# Altium footprint library mobinbyn-Capacitor.PcbLib: 152 footprints (part 10 of 10)
Each footprint in its own frame and in the unit in brackets; x right, y up, seen from the top. Pads: shape width x height; smd on the part's side, far side on the other; paste and mask are expansions set on the pad; w line width, h text height; cw(c..) or ccw(c..) is an arc to the next point about the centre after c.
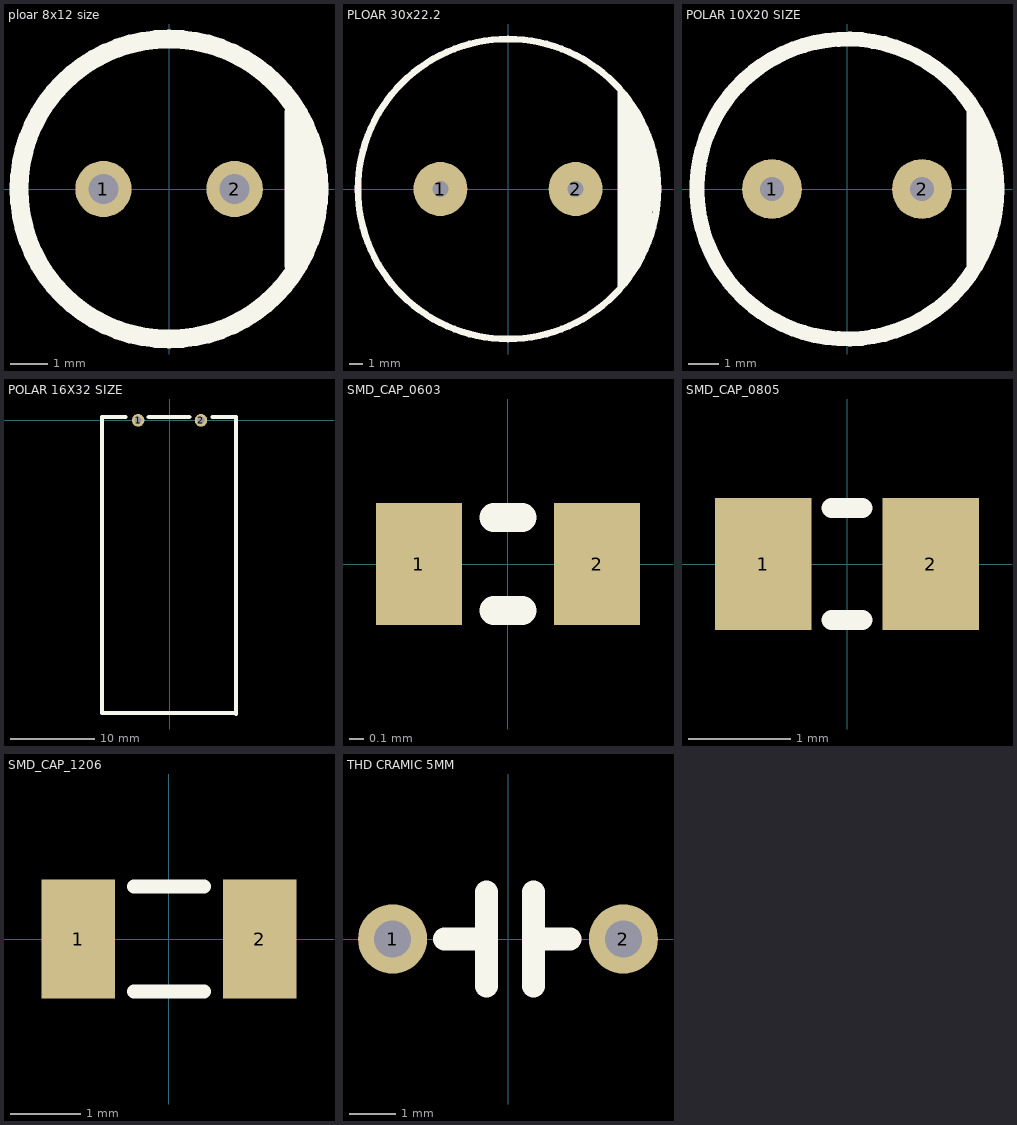
[diagram p9: the footprints below, top view; thin cyan lines are the x and y axes]

## ploar 8x12 size [mm]
pads (2):
  round 1.5 hole 0.8: 1(-1.75,0) 2(1.75,0)
Top Overlay:
  circle w0.5: c0,0 r4
  lines w0.5: 3.33,-2.032 3.33,1.27 3.711,0.889 3.711,-1.397 3.33,-1.778 3.33,2.032
3D body "CAPACITOR RADIAL 8X12.STEP": height 12, standoff -2.5, extent -4,-4 4,4

## PLOAR 30x22.2 [mm]
pads (2):
  round 4 hole 1.2: 1(-5,0) 2(5,0)
Top Overlay:
  circle w0.5: c0,0 r11.1
  lines w0.3: 8.255,-7.239 8.255,7.239 ; 8.509,-7.112 8.509,6.985 ; 8.636,-6.858 8.636,6.604 ; 8.89,-6.604 8.89,6.604 ; 9.144,6.096 9.144,-6.096 9.271,-6.096 9.271,5.715 9.398,5.715 9.398,-5.334 9.525,-5.334 9.525,5.08 9.652,5.08 9.652,4.826 ; 9.652,4.826 9.906,4.826 9.906,-5.08 9.779,-5.08 9.779,4.826 9.652,4.826 ; 9.652,4.826 9.652,4.318 10.033,4.318 10.033,-4.064 10.287,-4.064 10.287,3.937 10.16,3.937 10.16,-3.048 10.541,-3.048 10.541,3.048 10.287,3.048 10.287,1.778 10.668,1.778 ; 10.668,1.778 10.668,-1.524 10.922,-1.524 10.922,1.778 10.668,1.778
3D body "CAPASITOR 22.3x33.STEP": height 33.37, standoff -4.63, extent -11.1,-11.1 11.1,11.1

## POLAR 10X20 SIZE [mm]
pads (2):
  round 2 hole 0.8: 1(-2.5,0) 2(2.5,0)
Top Overlay:
  circle w0.5: c0,0 r5
  lines w0.5: 4.231,2.54 4.231,-2.54 4.358,-2.413 4.358,-1.016 4.485,-0.889 4.485,0.635 4.612,0.762 4.612,1.397 4.739,1.27 4.739,-0.127
3D body "User Library-Cap electro 10x20x5_0mm.step": height 20.28, standoff -3.99, extent -5.025,-5.027 5.026,5.023

## POLAR 16X32 SIZE [mm]
pads (2):
  round 1.5 hole 0.8: 1(-3.75,0) 2(3.75,0)
Top Overlay:
  lines w0.5: -5.274,0.381 -8.068,0.381 -8.068,-34.925 7.807,-34.925 7.934,-35.052 7.934,0.381 5.14,0.381 ; -2.48,0.381 2.346,0.381
3D body "User Library-Cap electrolitic radial 16x32.STEP": height 16.5, standoff -1.5, extent -7.997,-35 7.997,0.4

## SMD_CAP_0603 [mm]
pads (2):
  rect 0.6x0.85 smd: 1(-0.622,0) 2(0.622,0)
Top Overlay:
  lines w0.2: -0.1,-0.325 0.1,-0.325 ; -0.1,0.325 0.1,0.325
3D body "cap 0603.STEP": height 0.6, standoff 0, extent -0.762,-0.381 0.762,0.381

## SMD_CAP_0805 [mm]
pads (2):
  rect 0.95x1.3 smd: 1(-0.825,0) 2(0.825,0)
Top Overlay:
  lines w0.2: -0.15,-0.55 0.15,-0.55 ; -0.15,0.55 0.15,0.55
3D body "cap 0805.STEP": height 0.65, standoff 0, extent -1.016,-0.635 1.016,0.635

## SMD_CAP_1206 [mm]
pads (2):
  rect 1.05x1.7 smd: 1(-1.298,0) 2(1.298,0)
Top Overlay:
  lines w0.2: -0.5,-0.75 0.5,-0.75 ; -0.5,0.75 0.5,0.75
3D body "cap 1206.STEP": height 0.75, standoff 0, extent -1.522,-0.775 1.526,0.749

## THD CRAMIC 5MM [mm]
pads (2):
  round 1.5 hole 0.8: 1(-2.5,0) 2(2.5,0)
Top Overlay:
  lines w0.5: -1.372,0 -0.468,0 -0.468,-1.016 -0.468,1.016 ; 0.548,-1.016 0.548,1.016 ; 0.548,0 1.346,0
3D body "DIP ceramic CAP.STEP": height 7.54, standoff -1.5, extent -2.75,-1.25 2.75,1.25